# Altium footprint library Indruino.PcbLib: 383 footprints (part 7 of 24)
Each footprint in its own frame and in the unit in brackets; x right, y up, seen from the top. Pads: shape width x height; smd on the part's side, far side on the other; paste and mask are expansions set on the pad; w line width, h text height; cw(c..) or ccw(c..) is an arc to the next point about the centre after c.
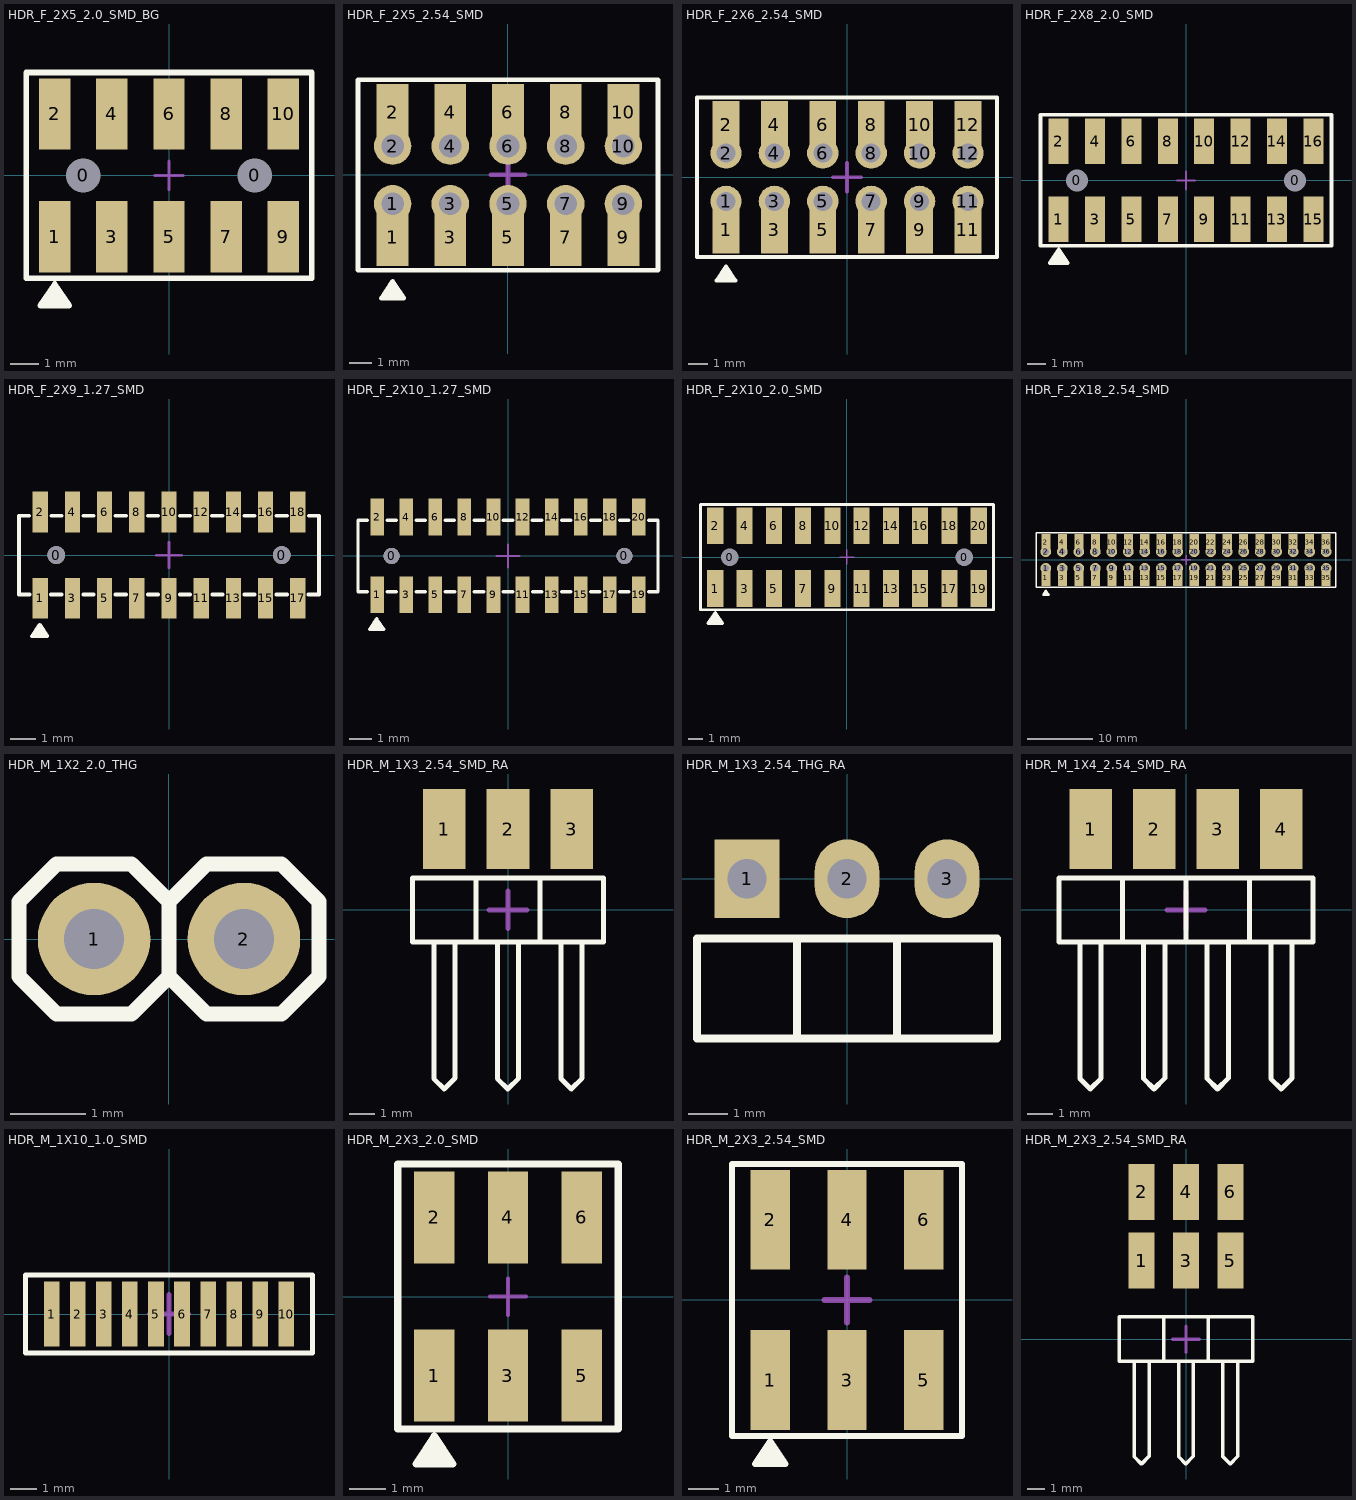
[diagram p6: the footprints below, top view; thin cyan lines are the x and y axes]

## HDR_F_2X5_2.0_SMD_BG [mm]
pads (12):
  round 1 hole 1.2: 0(-3,0) 0(3,0)
  rect 1.1x2.5 smd: 1(-4,-2.15) 2(-4,2.15) 3(-2,-2.15) 4(-2,2.15) 5(0,-2.15) 6(0,2.15) 7(2,-2.15) 8(2,2.15) 9(4,-2.15) 10(4,2.15)
Top Overlay:
  region: -4.5,-4.55 -3.5,-4.55 -4,-3.8
  lines w0.2: -5,-3.6 5,-3.6 5,3.6 -5,3.6 -5,-3.6 ; -4.5,-4.55 -3.5,-4.55 -4,-3.8 -4.5,-4.55
Mechanical 15:
  lines w0.1: -0.5,0 0.5,0 ; 0,-0.5 0,0.5
3D body "A3A-10DA-2SV.stp": height 4.2, standoff -1.1, extent -5,-3 5,3

## HDR_F_2X5_2.54_SMD [mm]
pads (20):
  rect 1.4x2.5 smd: 1(-5.08,-2.75) 2(-5.08,2.75) 3(-2.54,-2.75) 4(-2.54,2.75) 5(0,-2.75) 6(0,2.75) 7(2.54,-2.75) 8(2.54,2.75) 9(5.08,-2.75) 10(5.08,2.75)
  round 1.65 hole 1: 1(-5.08,-1.27) 2(-5.08,1.27) 3(-2.54,-1.27) 4(-2.54,1.27) 5(0,-1.27) 6(0,1.27) 7(2.54,-1.27) 8(2.54,1.27) 9(5.08,-1.27) 10(5.08,1.27)
Top Overlay:
  region: -5.58,-5.43 -4.58,-5.43 -5.08,-4.68
  lines w0.2: -6.604,-4.191 -6.604,4.191 6.604,4.191 6.604,-4.191 -6.604,-4.191 ; -5.58,-5.43 -5.08,-4.68 -4.58,-5.43 -5.58,-5.43
Mechanical 15:
  lines w0.2: -0.75,0 0.75,0 ; 0,-0.75 0,0.75
3D body "C052KFMS-RC.STEP": height 7.5, standoff 0, extent -6.6,-3.425 6.6,3.421

## HDR_F_2X6_2.54_SMD [mm]
pads (24):
  rect 1.4x2.5 smd: 1(-6.35,-2.75) 2(-6.35,2.75) 3(-3.81,-2.75) 4(-3.81,2.75) 5(-1.27,-2.75) 6(-1.27,2.75) 7(1.27,-2.75) 8(1.27,2.75) 9(3.81,-2.75) 10(3.81,2.75) 11(6.35,-2.75) 12(6.35,2.75)
  round 1.65 hole 1: 1(-6.35,-1.27) 2(-6.35,1.27) 3(-3.81,-1.27) 4(-3.81,1.27) 5(-1.27,-1.27) 6(-1.27,1.27) 7(1.27,-1.27) 8(1.27,1.27) 9(3.81,-1.27) 10(3.81,1.27) 11(6.35,-1.27) 12(6.35,1.27)
Top Overlay:
  region: -6.85,-5.43 -5.85,-5.43 -6.35,-4.68
  lines w0.2: -7.874,-4.191 7.874,-4.191 7.874,4.191 -7.874,4.191 -7.874,-4.191 ; -6.85,-5.43 -5.85,-5.43 -6.35,-4.68 -6.85,-5.43
Mechanical 15:
  lines w0.2: -0.75,0 0.75,0 ; 0,-0.75 0,0.75
3D body "C062KFMS-RC.STEP": height 7.5, standoff 0, extent -7.87,-3.425 7.87,3.421

## HDR_F_2X8_2.0_SMD [mm]
pads (18):
  round 1 hole 1.2: 0(-6,0) 0(6,0)
  rect 1.1x2.5 smd: 1(-7,-2.15) 2(-7,2.15) 3(-5,-2.15) 4(-5,2.15) 5(-3,-2.15) 6(-3,2.15) 7(-1,-2.15) 8(-1,2.15) 9(1,-2.15) 10(1,2.15) 11(3,-2.15) 12(3,2.15) 13(5,-2.15) 14(5,2.15) 15(7,-2.15) 16(7,2.15)
Top Overlay:
  region: -7.5,-4.55 -6.5,-4.55 -7,-3.8
  lines w0.2: -8,-3.6 -8,3.6 8,3.6 8,-3.6 -8,-3.6 ; -7.5,-4.55 -7,-3.8 -6.5,-4.55 -7.5,-4.55
Mechanical 15:
  lines w0.1: -0.5,0 0.5,0 ; 0,-0.5 0,0.5
3D body "2.0 FEMALE HEADER_8X2PINS.STEP": height 4.6, standoff 0, extent -8.25,-3.1 8.25,3.1

## HDR_F_2X9_1.27_SMD [mm]
pads (20):
  round 0.7 hole 0.7: 0(-4.445,0) 0(4.445,0)
  rect 0.6x1.6 smd: 1(-5.08,-1.7) 2(-5.08,1.7) 3(-3.81,-1.7) 4(-3.81,1.7) 5(-2.54,-1.7) 6(-2.54,1.7) 7(-1.27,-1.7) 8(-1.27,1.7) 9(0,-1.7) 10(0,1.7) 11(1.27,-1.7) 12(1.27,1.7) 13(2.54,-1.7) 14(2.54,1.7) 15(3.81,-1.7) 16(3.81,1.7) 17(5.08,-1.7) 18(5.08,1.7)
Top Overlay:
  region: -5.4,-3.2 -5.1,-2.75 -4.8,-3.2
  lines w0.15: -5.51,1.555 -5.915,1.555 -5.915,-1.555 -5.505,-1.555 ; -4.65,-1.555 -4.24,-1.555 ; -4.645,1.555 -4.235,1.555 ; -3.38,-1.555 -2.97,-1.555 ; -3.38,1.555 -2.97,1.555 ; -2.11,1.555 -1.7,1.555 ; -2.105,-1.555 -1.695,-1.555 ; -0.84,-1.555 -0.43,-1.555 ; -0.835,1.555 -0.425,1.555 ; 0.43,-1.555 0.84,-1.555 ; 0.43,1.555 0.84,1.555 ; 1.7,1.555 2.11,1.555 ; 1.705,-1.555 2.115,-1.555 ; 2.97,-1.555 3.38,-1.555 ; 2.975,1.555 3.385,1.555 ; 4.24,-1.555 4.65,-1.555 ; 4.24,1.555 4.65,1.555 ; 5.505,-1.555 5.915,-1.555 5.915,1.555 5.51,1.555 ; -5.4,-3.2 -4.8,-3.2 -5.1,-2.75 -5.4,-3.2
Mechanical 15:
  lines w0.1: -0.5,0 0.5,0 ; 0,-0.5 0,0.5
3D body "CLP-109-02-F-D-A-TR.stp": height 2.26, standoff -0.51, extent -5.931,-2.159 5.931,2.159

## HDR_F_2X10_1.27_SMD [mm]
pads (22):
  round 0.7 hole 0.7: 0(-5.08,0) 0(5.08,0)
  rect 0.6x1.6 smd: 1(-5.715,-1.7) 2(-5.715,1.7) 3(-4.445,-1.7) 4(-4.445,1.7) 5(-3.175,-1.7) 6(-3.175,1.7) 7(-1.905,-1.7) 8(-1.905,1.7) 9(-0.635,-1.7) 10(-0.635,1.7) 11(0.635,-1.7) 12(0.635,1.7) 13(1.905,-1.7) 14(1.905,1.7) 15(3.175,-1.7) 16(3.175,1.7) 17(4.445,-1.7) 18(4.445,1.7) 19(5.715,-1.7) 20(5.715,1.7)
Top Overlay:
  region: -6.035,-3.2 -5.735,-2.75 -5.435,-3.2
  lines w0.15: -6.145,1.555 -6.55,1.555 -6.55,-1.555 -6.14,-1.555 ; -5.285,-1.555 -4.875,-1.555 ; -5.28,1.555 -4.87,1.555 ; -4.015,-1.555 -3.605,-1.555 ; -4.015,1.555 -3.605,1.555 ; -2.745,1.555 -2.335,1.555 ; -2.74,-1.555 -2.33,-1.555 ; -1.475,-1.555 -1.065,-1.555 ; -1.47,1.555 -1.06,1.555 ; -0.205,-1.555 0.205,-1.555 ; -0.205,1.555 0.205,1.555 ; 1.065,1.555 1.475,1.555 ; 1.07,-1.555 1.48,-1.555 ; 2.335,-1.555 2.745,-1.555 ; 2.34,1.555 2.75,1.555 ; 3.605,-1.555 4.015,-1.555 ; 3.61,1.555 4.02,1.555 ; 4.875,-1.555 5.285,-1.555 ; 4.875,1.555 5.285,1.555 ; 6.14,-1.555 6.55,-1.555 6.55,1.555 6.145,1.555 ; -6.035,-3.2 -5.435,-3.2 -5.735,-2.75 -6.035,-3.2
Mechanical 15:
  lines w0.1: -0.5,0 0.5,0 ; 0,-0.5 0,0.5
3D body "CLP-110-02-F-D-A-TR.stp": height 2.26, standoff -0.51, extent -6.566,-2.159 6.566,2.159

## HDR_F_2X10_2.0_SMD [mm]
pads (22):
  round 1 hole 1.2: 0(-8,0) 0(8,0)
  rect 1.1x2.5 smd: 1(-9,-2.15) 2(-9,2.15) 3(-7,-2.15) 4(-7,2.15) 5(-5,-2.15) 6(-5,2.15) 7(-3,-2.15) 8(-3,2.15) 9(-1,-2.15) 10(-1,2.15) 11(1,-2.15) 12(1,2.15) 13(3,-2.15) 14(3,2.15) 15(5,-2.15) 16(5,2.15) 17(7,-2.15) 18(7,2.15) 19(9,-2.15) 20(9,2.15)
Top Overlay:
  region: -9.5,-4.55 -8.5,-4.55 -9,-3.8
  lines w0.2: -10,-3.6 -10,3.6 10,3.6 10,-3.6 -10,-3.6 ; -9.5,-4.55 -9,-3.8 -8.5,-4.55 -9.5,-4.55
Mechanical 15:
  lines w0.1: -0.5,0 0.5,0 ; 0,-0.5 0,0.5
3D body "A3A-20DA-2SV.stp": height 4.2, standoff -1.1, extent -10,-3 10,3

## HDR_F_2X18_2.54_SMD [mm]
pads (72):
  rect 1.4x2.5 smd: 1(-21.59,-2.75) 2(-21.59,2.75) 3(-19.05,-2.75) 4(-19.05,2.75) 5(-16.51,-2.75) 6(-16.51,2.75) 7(-13.97,-2.75) 8(-13.97,2.75) 9(-11.43,-2.75) 10(-11.43,2.75) 11(-8.89,-2.75) 12(-8.89,2.75) 13(-6.35,-2.75) 14(-6.35,2.75) 15(-3.81,-2.75) 16(-3.81,2.75) 17(-1.27,-2.75) 18(-1.27,2.75) 19(1.27,-2.75) 20(1.27,2.75) 21(3.81,-2.75) 22(3.81,2.75) 23(6.35,-2.75) 24(6.35,2.75) 25(8.89,-2.75) 26(8.89,2.75) 27(11.43,-2.75) 28(11.43,2.75) 29(13.97,-2.75) 30(13.97,2.75) 31(16.51,-2.75) 32(16.51,2.75) 33(19.05,-2.75) 34(19.05,2.75) 35(21.59,-2.75) 36(21.59,2.75)
  round 1.65 hole 1: 1(-21.59,-1.27) 2(-21.59,1.27) 3(-19.05,-1.27) 4(-19.05,1.27) 5(-16.51,-1.27) 6(-16.51,1.27) 7(-13.97,-1.27) 8(-13.97,1.27) 9(-11.43,-1.27) 10(-11.43,1.27) 11(-8.89,-1.27) 12(-8.89,1.27) 13(-6.35,-1.27) 14(-6.35,1.27) 15(-3.81,-1.27) 16(-3.81,1.27) 17(-1.27,-1.27) 18(-1.27,1.27) 19(1.27,-1.27) 20(1.27,1.27) 21(3.81,-1.27) 22(3.81,1.27) 23(6.35,-1.27) 24(6.35,1.27) 25(8.89,-1.27) 26(8.89,1.27) 27(11.43,-1.27) 28(11.43,1.27) 29(13.97,-1.27) 30(13.97,1.27) 31(16.51,-1.27) 32(16.51,1.27) 33(19.05,-1.27) 34(19.05,1.27) 35(21.59,-1.27) 36(21.59,1.27)
Top Overlay:
  region: -22.09,-5.43 -21.09,-5.43 -21.59,-4.68
  lines w0.2: -23.114,-4.191 -23.114,4.191 23.114,4.191 23.114,-4.191 -23.114,-4.191 ; -22.09,-5.43 -21.59,-4.68 -21.09,-5.43 -22.09,-5.43
Mechanical 15:
  lines w0.2: -0.75,0 0.75,0 ; 0,-0.75 0,0.75
3D body "C182KFMS-RC.STEP": height 7.5, standoff 0, extent -23.11,-3.425 23.11,3.421

## HDR_M_1X2_2.0_THG [mm]
pads (2):
  round 1.5 hole 0.8: 1(-1,0) 2(1,0)
Top Overlay:
  lines w0.2: 0,-0.5 0,0.5 ; 0,-0.5 0.5,-1 1.5,-1 2,-0.5 2,0.5 1.5,1 0.5,1 0,0.5 ; 0,-0.5 -0.5,-1 -1.5,-1 -2,-0.5 -2,0.5 -1.5,1 -0.5,1 0,0.5
3D body "Male-hdr-2mm.STEP": height 5.9, standoff -2.8, extent -2,-1 0,1
3D body "Male-hdr-2mm.STEP": height 5.9, standoff -2.8, extent 0,-1 2,1

## HDR_M_1X3_2.54_SMD_RA [mm]
pads (3):
  rect 1.7x3.2 smd: 1(-2.54,3.23) 2(0,3.23) 3(2.54,3.23)
Top Overlay:
  lines w0.2: -2.963,-1.27 -2.963,-6.737 -2.55,-7.15 -2.117,-6.717 -2.117,-1.27 ; -1.27,-1.27 -1.27,1.27 ; -0.423,-1.27 -0.423,-6.737 -0.01,-7.15 0.423,-6.717 0.423,-1.27 ; 1.27,-1.27 1.27,1.27 ; 2.117,-1.27 2.117,-6.737 2.53,-7.15 2.963,-6.717 2.963,-1.27 ; -3.81,-1.27 -3.81,1.27 3.81,1.27 3.81,-1.27 -3.81,-1.27
Mechanical 15:
  lines w0.2: -0.75,0 0.75,0 ; 0,-0.75 0,0.75
3D body "pin_header_a-sl254-ea-g03mp1.stp": height 2.52, standoff 0.02, extent -3.81,-7.23 3.81,4.27

## HDR_M_1X3_2.54_THG_RA [mm]
pads (3):
  rect 1.65x2 hole 1: 1(-2.54,0)
  oval 1.65x2 hole 1: 2(0,0) 3(2.54,0)
Top Overlay:
  lines w0.2: -1.27,-4.06 -1.27,-1.52 ; 1.27,-4.06 1.27,-1.52 ; -3.81,-4.06 -3.81,-1.52 3.81,-1.52 3.81,-4.06 -3.81,-4.06
3D body "header_right_angle_3x1_male.stp": height 2.54, standoff -3.05, extent -3.77,-10.08 3.85,0.28

## HDR_M_1X4_2.54_SMD_RA [mm]
pads (4):
  rect 1.7x3.2 smd: 1(-3.81,3.23) 2(-1.27,3.23) 3(1.27,3.23) 4(3.81,3.23)
Top Overlay:
  lines w0.2: -4.233,-1.27 -4.233,-6.737 -3.82,-7.15 -3.387,-6.717 -3.387,-1.27 ; -2.54,-1.27 -2.54,1.27 ; -1.693,-1.27 -1.693,-6.737 -1.28,-7.15 -0.847,-6.717 -0.847,-1.27 ; 0,-1.27 0,1.27 ; 0.847,-1.27 0.847,-6.737 1.26,-7.15 1.693,-6.717 1.693,-1.27 ; 2.54,-1.27 2.54,1.27 ; 3.387,-1.27 3.387,-6.737 3.8,-7.15 4.233,-6.717 4.233,-1.27 ; -5.08,-1.27 -5.08,1.27 5.08,1.27 5.08,-1.27 -5.08,-1.27
Mechanical 15:
  lines w0.2: -0.75,0 0.75,0 ; 0,-0.75 0,0.75
3D body "m20-8890445_asm.stp": height 2.54, standoff 0.04, extent -5.08,-7.25 5.08,4.246

## HDR_M_1X10_1.0_SMD [mm]
pads (10):
  rect 0.6x2.5 smd: 1(-4.5,0) 2(-3.5,0) 3(-2.5,0) 4(-1.5,0) 5(-0.5,0) 6(0.5,0) 7(1.5,0) 8(2.5,0) 9(3.5,0) 10(4.5,0)
Top Overlay:
  lines w0.2: -5.5,-1.5 5.5,-1.5 5.5,1.5 -5.5,1.5 -5.5,-1.5
Mechanical 15:
  lines w0.2: -0.75,0 0.75,0 ; 0,-0.75 0,0.75

## HDR_M_2X3_2.0_SMD [mm]
pads (6):
  rect 1.1x2.5 smd: 1(-2,-2.15) 2(-2,2.15) 3(0,-2.15) 4(0,2.15) 5(2,-2.15) 6(2,2.15)
Top Overlay:
  region: -2.5,-4.55 -1.5,-4.55 -2,-3.8
  lines w0.2: -3,-3.6 3,-3.6 3,3.6 -3,3.6 -3,-3.6 ; -2.5,-4.55 -1.5,-4.55 -2,-3.8 -2.5,-4.55
Mechanical 15:
  lines w0.1: -0.5,0 0.5,0 ; 0,-0.5 0,0.5
3D body "2.0 MALE HEADER_3X2PINS.STEP": height 7.3, standoff 0, extent -3,-3.3 3,3.3

## HDR_M_2X3_2.54_SMD [mm]
pads (6):
  rect 1.3x3.3 smd: 1(-2.54,-2.65) 2(-2.54,2.65) 3(0,-2.65) 4(0,2.65) 5(2.54,-2.65) 6(2.54,2.65)
Top Overlay:
  region: -3.04,-5.43 -2.04,-5.43 -2.54,-4.68
  lines w0.2: -3.81,-4.5 -3.81,4.5 3.81,4.5 3.81,-4.5 -3.81,-4.5 ; -3.04,-5.43 -2.54,-4.68 -2.04,-5.43 -3.04,-5.43
Mechanical 15:
  lines w0.2: -0.75,0 0.75,0 ; 0,-0.75 0,0.75
3D body "pin_header_a-sl254-dg-g06mp1.stp": height 9.75, standoff 0.01, extent -3.81,-3.75 3.81,3.75

## HDR_M_2X3_2.54_SMD_RA [mm]
pads (6):
  rect 1.5x3.2 smd: 1(-2.54,4.5) 2(-2.54,8.43) 3(0,4.5) 4(0,8.43) 5(2.54,4.5) 6(2.54,8.43)
Top Overlay:
  lines w0.2: -2.963,-1.27 -2.963,-6.737 -2.55,-7.15 -2.117,-6.717 -2.117,-1.27 ; -1.27,-1.27 -1.27,1.27 ; -0.423,-1.27 -0.423,-6.737 -0.01,-7.15 0.423,-6.717 0.423,-1.27 ; 1.27,-1.27 1.27,1.27 ; 2.117,-1.27 2.117,-6.737 2.53,-7.15 2.963,-6.717 2.963,-1.27 ; -3.81,-1.27 -3.81,1.27 3.81,1.27 3.81,-1.27 -3.81,-1.27
Mechanical 15:
  lines w0.2: -0.75,0 0.75,0 ; 0,-0.75 0,0.75
3D body "pin_header_a-sl254-da-g06mp1.stp": height 5.04, standoff 0.02, extent -3.81,-7.25 3.81,8.87